# Altium footprint library MOLEX SMD.PcbLib: 54 footprints (part 3 of 4) (continued)
## MOLEX_78171-0004 [mm] "1.20mm Pitch Pico-EZmate Wire-to-Board Header, Vertical, Housing Height: 1.55mm, with Side-Friction Locks, 4 Circuits" (continued)
Mechanical 15:
  lines w0.05: -3.55,-4.59 -3.55,0.665 3.55,0.665 3.55,-4.59 -3.55,-4.59
3D body "MOLEX_78171-0004.stp": height 1.45, standoff 0, extent -3.3,-4.34 3.3,0.19

## MOLEX_78565-0001 [mm] "1.00mm Pitch Aerodynamic DDR3 RDIMM Socket, Low Profile, Vertical, Surface Mount, Black Housing and Latches, 240 Circuits, Lead-Free"
height 21.69
pads (243):
  rect 0.7x2.1 smd: 1(-49.5,-2.45) 2(-48.5,-2.45) 3(-47.5,-2.45) 4(-46.5,-2.45) 5(-45.5,-2.45) 6(-44.5,-2.45) 7(-43.5,-2.45) 8(-42.5,-2.45) 9(-41.5,-2.45) 10(-40.5,-2.45) 11(-39.5,-2.45) 12(-38.5,-2.45) 13(-37.5,-2.45) 14(-36.5,-2.45) 15(-35.5,-2.45) 16(-34.5,-2.45) 17(-33.5,-2.45) 18(-32.5,-2.45) 19(-31.5,-2.45) 20(-30.5,-2.45) 21(-29.5,-2.45) 22(-28.5,-2.45) 23(-27.5,-2.45) 24(-26.5,-2.45) 25(-25.5,-2.45) 26(-24.5,-2.45) 27(-23.5,-2.45) 28(-22.5,-2.45) 29(-21.5,-2.45) 30(-20.5,-2.45) 31(-19.5,-2.45) 32(-18.5,-2.45) 33(-17.5,-2.45) 34(-16.5,-2.45) 35(-15.5,-2.45) 36(-14.5,-2.45) 37(-13.5,-2.45) 38(-12.5,-2.45) 39(-11.5,-2.45) 40(-10.5,-2.45) 41(-9.5,-2.45) 42(-8.5,-2.45) 43(-7.5,-2.45) 44(-6.5,-2.45) 45(-5.5,-2.45) 46(-4.5,-2.45) 47(-3.5,-2.45) 48(-2.5,-2.45) 49(2.5,-2.45) 50(3.5,-2.45) 51(4.5,-2.45) 52(5.5,-2.45) 53(6.5,-2.45) 54(7.5,-2.45) 55(8.5,-2.45) 56(9.5,-2.45) 57(10.5,-2.45) 58(11.5,-2.45) 59(12.5,-2.45) 60(13.5,-2.45) 61(14.5,-2.45) 62(15.5,-2.45) 63(16.5,-2.45) 64(17.5,-2.45) 65(18.5,-2.45) 66(19.5,-2.45) 67(20.5,-2.45) 68(21.5,-2.45) 69(22.5,-2.45) 70(23.5,-2.45) 71(24.5,-2.45) 72(25.5,-2.45) 73(26.5,-2.45) 74(27.5,-2.45) 75(28.5,-2.45) 76(29.5,-2.45) 77(30.5,-2.45) 78(31.5,-2.45) 79(32.5,-2.45) 80(33.5,-2.45) 81(34.5,-2.45) 82(35.5,-2.45) 83(36.5,-2.45) 84(37.5,-2.45) 85(38.5,-2.45) 86(39.5,-2.45) 87(40.5,-2.45) 88(41.5,-2.45) 89(42.5,-2.45) 90(43.5,-2.45) 91(44.5,-2.45) 92(45.5,-2.45) 93(46.5,-2.45) 94(47.5,-2.45) 95(48.5,-2.45) 96(49.5,-2.45) 97(50.5,-2.45) 98(51.5,-2.45) 99(52.5,-2.45) 100(53.5,-2.45) 101(54.5,-2.45) 102(55.5,-2.45) 103(56.5,-2.45) 104(57.5,-2.45) 105(58.5,-2.45) 106(59.5,-2.45) 107(60.5,-2.45) 108(61.5,-2.45) 109(62.5,-2.45) 110(63.5,-2.45) 111(64.5,-2.45) 112(65.5,-2.45) 113(66.5,-2.45) 114(67.5,-2.45) 115(68.5,-2.45) 116(69.5,-2.45) 117(70.5,-2.45) 118(71.5,-2.45) 119(72.5,-2.45) 120(73.5,-2.45) 121(-49.5,2.45) 122(-48.5,2.45) 123(-47.5,2.45) 124(-46.5,2.45) 125(-45.5,2.45) 126(-44.5,2.45) 127(-43.5,2.45) 128(-42.5,2.45) 129(-41.5,2.45) 130(-40.5,2.45) 131(-39.5,2.45) 132(-38.5,2.45) 133(-37.5,2.45) 134(-36.5,2.45) 135(-35.5,2.45) 136(-34.5,2.45) 137(-33.5,2.45) 138(-32.5,2.45) 139(-31.5,2.45) 140(-30.5,2.45) 141(-29.5,2.45) 142(-28.5,2.45) 143(-27.5,2.45) 144(-26.5,2.45) 145(-25.5,2.45) 146(-24.5,2.45) 147(-23.5,2.45) 148(-22.5,2.45) 149(-21.5,2.45) 150(-20.5,2.45) 151(-19.5,2.45) 152(-18.5,2.45) 153(-17.5,2.45) 154(-16.5,2.45) 155(-15.5,2.45) 156(-14.5,2.45) 157(-13.5,2.45) 158(-12.5,2.45) 159(-11.5,2.45) 160(-10.5,2.45) 161(-9.5,2.45) 162(-8.5,2.45) 163(-7.5,2.45) 164(-6.5,2.45) 165(-5.5,2.45) 166(-4.5,2.45) 167(-3.5,2.45) 168(-2.5,2.45) 169(2.5,2.45) 170(3.5,2.45) 171(4.5,2.45) 172(5.5,2.45) 173(6.5,2.45) 174(7.5,2.45) 175(8.5,2.45) 176(9.5,2.45) 177(10.5,2.45) 178(11.5,2.45) 179(12.5,2.45) 180(13.5,2.45) 181(14.5,2.45) 182(15.5,2.45) 183(16.5,2.45) 184(17.5,2.45) 185(18.5,2.45) 186(19.5,2.45) 187(20.5,2.45) 188(21.5,2.45) 189(22.5,2.45) 190(23.5,2.45) 191(24.5,2.45) 192(25.5,2.45) 193(26.5,2.45) 194(27.5,2.45) 195(28.5,2.45) 196(29.5,2.45) 197(30.5,2.45) 198(31.5,2.45) 199(32.5,2.45) 200(33.5,2.45) 201(34.5,2.45) 202(35.5,2.45) 203(36.5,2.45) 204(37.5,2.45) 205(38.5,2.45) 206(39.5,2.45) 207(40.5,2.45) 208(41.5,2.45) 209(42.5,2.45) 210(43.5,2.45) 211(44.5,2.45) 212(45.5,2.45) 213(46.5,2.45) 214(47.5,2.45) 215(48.5,2.45) 216(49.5,2.45) 217(50.5,2.45) 218(51.5,2.45) 219(52.5,2.45) 220(53.5,2.45) 221(54.5,2.45) 222(55.5,2.45) 223(56.5,2.45) 224(57.5,2.45) 225(58.5,2.45) 226(59.5,2.45) 227(60.5,2.45) 228(61.5,2.45) 229(62.5,2.45) 230(63.5,2.45) 231(64.5,2.45) 232(65.5,2.45) 233(66.5,2.45) 234(67.5,2.45) 235(68.5,2.45) 236(69.5,2.45) 237(70.5,2.45) 238(71.5,2.45) 239(72.5,2.45) 240(73.5,2.45)
  round 3.2 hole 2.5 unplated mask+0.15: H1(-57,0) H2(0,0) H3(81,0)
Top Overlay:
  drawing of 164 lines, arcs and shapes, not listed
  text "240" at 74.4,3.6 h1
  text "1" at -50.6,-4.5 h1
Mechanical 8:
  drawing of 1927 lines, arcs and shapes, not listed
Mechanical 14:
  drawing of 204 lines, arcs and shapes, not listed
  text "240" at 74.4,3.6 h1
  text "1" at -50.6,-4.5 h1
3D body "MOLEX_78565-0001.stp": height 21.16, standoff -3.75, extent -64.885,-3.209 88.885,3.21

## MOLEX_85305-0232 [mm] "50 Ohms, SMP Surface Mount Plug, Limited Detent"
height 4.1
pads (2):
  rect 0.54x1.3 smd: 1(0,3.05)
  rect 0.5x0.5 smd paste-0.25 mask-0.25: 2(-2.35,2.35)
Top Layer:
  region: -2.6,-2.6 -2.6,2.6 -1,2.6 -1,1.732 -1.183,1.613 -1.504,1.319 -1.754,0.962 -1.92,0.56 -1.996,0.131 -1.977,-0.304 -1.864,-0.725 -1.663,-1.111 -1.383,-1.445 -1.038,-1.71 -0.643,-1.894 -0.218,-1.988 0.218,-1.988 0.643,-1.894 1.037,-1.71 1.383,-1.445 1.663,-1.111 1.864,-0.725 1.977,-0.304 1.996,0.131 1.92,0.56 1.753,0.962 1.504,1.319 1.183,1.613 1,1.732 1,2.6 2.6,2.6 2.6,-2.6
Top Overlay:
  circle w0.2: c0,0 r0.205
  circle w0.2: c0,0 r1.55
  lines w0.2: -0.65,1.997 cw(c0,0) 0.65,1.997
Mechanical 8:
  circle w0.05: c-2.079,-1.2 r0.2
  circle w0.05: c-1.2,-2.078 r0.2
  circle w0.05: c1.2,-2.078 r0.2
  circle w0.05: c2.078,-1.2 r0.2
  circle w0.05: c-1.543,1.839 r0.2
  circle w0.05: c-2.255,0.821 r0.2
  circle w0.05: c1.543,1.839 r0.2
  circle w0.05: c2.255,0.821 r0.2
  lines w0.05: -2.755,0.821 -2.255,0.821 ; -2.579,-1.2 -2.079,-1.2 ; -2.255,0.321 -2.255,0.821 ; -2.255,1.321 -2.255,0.821 ; -2.079,-1.7 -2.079,-1.2 ; -2.079,-0.7 -2.079,-1.2 ; -2.043,1.839 -1.543,1.839 ; -1.755,0.821 -2.255,0.821 ; -1.7,-2.078 -1.2,-2.078 ; -1.579,-1.2 -2.079,-1.2 ; -1.543,1.339 -1.543,1.839 ; -1.543,2.339 -1.543,1.839 ; -1.2,-2.578 -1.2,-2.078 ; -1.2,-1.578 -1.2,-2.078 ; -1.043,1.839 -1.543,1.839 ; -0.7,-2.078 -1.2,-2.078 ; -0.5,0 0,0 ; -0.5,3.05 0,3.05 ; 0,-0.5 0,0 ; 0,0.5 0,0 ; 0,2.55 0,3.05 ; 0,3.55 0,3.05 ; 0.5,0 0,0 ; 0.5,3.05 0,3.05 ; 0.7,-2.078 1.2,-2.078 ; 1.043,1.839 1.543,1.839 ; 1.2,-2.578 1.2,-2.078 ; 1.2,-1.578 1.2,-2.078 ; 1.543,1.339 1.543,1.839 ; 1.543,2.339 1.543,1.839 ; 1.578,-1.2 2.078,-1.2 ; 1.7,-2.078 1.2,-2.078 ; 1.755,0.821 2.255,0.821 ; 2.043,1.839 1.543,1.839 ; 2.078,-1.7 2.078,-1.2 ; 2.078,-0.7 2.078,-1.2 ; 2.255,0.321 2.255,0.821 ; 2.255,1.321 2.255,0.821 ; 2.578,-1.2 2.078,-1.2 ; 2.755,0.821 2.255,0.821 ; -2.6,-2.6 2.6,-2.6 2.6,2.6 1,2.6 1,1.732 cw(c0,0) -1,1.732 -1,2.6 -2.6,2.6 -2.6,-2.6 ; -0.27,2.4 0.27,2.4 0.27,3.7 -0.27,3.7 -0.27,2.4
Mechanical 14:
  circle w0.1: c0,0 r2.1
  circle w0.1: c0,0 r1.84
  circle w0.1: c0,0 r0.205
  circle w0.1: c0,0 r1.55
  lines w0.1: -2.54,-1.259 ccw(c0,0) -1.259,-2.54 ; -2.54,1.259 cw(c0,0) -1.259,2.54 ; -0.25,2.54 -0.25,3.54 0.25,3.54 0.25,2.54 ; 1.259,-2.54 ccw(c0,0) 2.54,-1.259 ; 1.259,2.54 cw(c0,0) 2.54,1.259 ; -2.54,-2.028 ccw(c0,0) -2.028,-2.54 2.027,-2.54 ccw(c0,0) 2.54,-2.028 2.54,2.028 ccw(c0,0) 2.027,2.54 -2.028,2.54 ccw(c0,0) -2.54,2.028 -2.54,-2.028
Mechanical 15:
  lines w0.05: -2.85,-2.85 -2.85,2.85 -0.52,2.85 -0.52,3.95 0.52,3.95 0.52,2.85 2.85,2.85 2.85,-2.85 -2.85,-2.85
3D body "MOLEX_85305-0232.stp": height 4.1, standoff 0, extent -2.54,-2.54 2.54,3.54

## MOLEX_85513-5014 [mm] "1.27mm Pitch, Modular Jack, Vertical, Top Entry, Surface Mount, 6/6, Low Profile"
height 12.7
pads (7):
  rect 5x0.76 smd: 1(-7.66,-3.175) 2(-7.66,-1.905) 3(-7.66,-0.635) 4(-7.66,0.635) 5(-7.66,1.905) 6(-7.66,3.175)
  rect 4.5x8.8 smd: SHIELD(8.39,0)
Top Overlay:
  lines w0.2: -7.54,-3.905 -7.54,-6.105 ccw(c-7.04,-6.105) -7.04,-6.605 7.04,-6.605 ccw(c7.04,-6.105) 7.54,-6.105 7.54,-4.75 ; -7.54,3.905 -7.54,6.105 cw(c-7.04,6.105) -7.04,6.605 7.04,6.605 cw(c7.04,6.105) 7.54,6.105 7.54,4.75
Mechanical 8:
  lines w0.05: -0.5,0 0,0 ; 0,-0.5 0,0 ; 0,0.5 0,0 ; 0.5,0 0,0 ; 7.89,0 8.39,0 ; 8.39,-0.5 8.39,0 ; 8.39,0.5 8.39,0 ; 8.89,0 8.39,0 ; -10.16,-3.555 -10.16,-2.795 -5.16,-2.795 -5.16,-3.555 -10.16,-3.555 ; -10.16,-2.285 -10.16,-1.525 -5.16,-1.525 -5.16,-2.285 -10.16,-2.285 ; -10.16,-1.015 -10.16,-0.255 -5.16,-0.255 -5.16,-1.015 -10.16,-1.015 ; -10.16,0.255 -10.16,1.015 -5.16,1.015 -5.16,0.255 -10.16,0.255 ; -10.16,1.525 -10.16,2.285 -5.16,2.285 -5.16,1.525 -10.16,1.525 ; -10.16,2.795 -10.16,3.555 -5.16,3.555 -5.16,2.795 -10.16,2.795 ; 6.14,-4.4 10.64,-4.4 10.64,4.4 6.14,4.4 6.14,-4.4
  lines w0.1: -8.16,-3.175 -7.66,-3.175 ; -8.16,-1.905 -7.66,-1.905 ; -8.16,-0.635 -7.66,-0.635 ; -8.16,0.635 -7.66,0.635 ; -8.16,1.905 -7.66,1.905 ; -8.16,3.175 -7.66,3.175 ; -7.66,-3.675 -7.66,-3.175 ; -7.66,-2.675 -7.66,-3.175 ; -7.66,-2.405 -7.66,-1.905 ; -7.66,-1.405 -7.66,-1.905 ; -7.66,-1.135 -7.66,-0.635 ; -7.66,-0.135 -7.66,-0.635 ; -7.66,0.135 -7.66,0.635 ; -7.66,1.135 -7.66,0.635 ; -7.66,1.405 -7.66,1.905 ; -7.66,2.405 -7.66,1.905 ; -7.66,2.675 -7.66,3.175 ; -7.66,3.675 -7.66,3.175 ; -7.16,-3.175 -7.66,-3.175 ; -7.16,-1.905 -7.66,-1.905 ; -7.16,-0.635 -7.66,-0.635 ; -7.16,0.635 -7.66,0.635 ; -7.16,1.905 -7.66,1.905 ; -7.16,3.175 -7.66,3.175 ; -0.5,0 0,0 ; 0,-0.5 0,0 ; 0,0.5 0,0 ; 0.5,0 0,0
Mechanical 14:
  lines w0.1: -7.54,-6.105 ccw(c-7.04,-6.105) -7.04,-6.605 7.04,-6.605 ccw(c7.04,-6.105) 7.54,-6.105 7.54,6.105 ccw(c7.04,6.105) 7.04,6.605 -7.04,6.605 ccw(c-7.04,6.105) -7.54,6.105 -7.54,-6.105 ; -3.34,-5.44 -3.34,5.44 4.46,5.44 4.46,3.85 6.21,3.85 6.21,2.525 7.02,2.525 7.02,-2.525 6.21,-2.525 6.21,-3.85 4.46,-3.85 4.46,-5.44 -3.34,-5.44
Mechanical 15:
  lines w0.05: -10.41,-3.805 -10.41,3.805 -10.16,3.805 -7.79,3.805 -7.79,6.605 -7.79,6.855 7.54,6.855 7.79,6.855 7.79,4.65 10.39,4.65 10.89,4.65 10.89,-4.65 7.79,-4.65 7.79,-6.855 -7.79,-6.855 -7.79,-3.805 -10.41,-3.805
3D body "MOLEX_85513-5014.stp": height 12.85, standoff 0, extent -9.54,-6.605 9.94,6.605

## MOLEX_87703-0001 [mm] "1.27mm Pitch Serial ATA Device Plug, 63.50mm Drive, Without Jumper, 22 Circuits"
height 4
pads (26):
  rect 3.66x4.4 smd: 1(-24.15,-4.8) 2(24.15,-4.8)
  round 0.5 hole 1.3 unplated mask+0.4: MTG1(-18.865,0) MTG2(18.865,0)
  rect 0.9x2.1 smd: P1(1.905,0) P2(0.635,0) P3(-0.635,0) P4(-1.905,0) P5(-3.175,0) P6(-4.445,0) P7(-5.715,0) P8(-6.985,0) P9(-8.255,0) P10(-9.525,0) P11(-10.795,0) P12(-12.065,0) P13(-13.335,0) P14(-14.605,0) P15(-15.875,0) S1(15.875,0) S2(14.605,0) S3(13.335,0) S4(12.065,0) S5(10.795,0) S6(9.525,0) S7(8.255,0)
Top Overlay:
  drawing of 164 lines, arcs and shapes, not listed
  text "S1" at 15.325,1.57 h1
  text "P1" at 1.38,1.62 h1
Keep-Out Layer:
  board cut-out: -21.765,-7.55 -21.765,-2.6 -21.765,-2.502 -21.727,-2.308 -21.651,-2.126 -21.542,-1.963 -21.402,-1.823 -21.239,-1.714 -21.057,-1.638 -20.864,-1.6 -20.765,-1.6 20.765,-1.6 20.864,-1.6 21.057,-1.638 21.239,-1.714 21.402,-1.823 21.542,-1.963 21.651,-2.126 21.727,-2.308 21.765,-2.502 21.765,-2.6 21.765,-7.55
Mechanical 1:
  lines w0.635: -21.765,-7.55 -21.765,-2.6 cw(c-20.765,-2.6) -20.765,-1.6 0,-1.6 20.765,-1.6 cw(c20.765,-2.6) 21.765,-2.6 21.765,-7.55
Mechanical 8:
  drawing of 215 lines, arcs and shapes, not listed
Mechanical 13:
  lines w0.254: 2.875,-2.65 2.875,-2.09
Mechanical 14:
  drawing of 190 lines, arcs and shapes, not listed
  text "S1" at 15.325,1.57 h1
  text "P1" at 1.38,1.62 h1
Mechanical 15:
  lines w0.05: -26.23,-7.8 -26.23,1.3 26.23,1.3 26.23,-7.8 -26.23,-7.8
3D body "MOLEX_87703-0001.stp": height 3.4, standoff -0.6, extent -25.465,-7.55 25.465,0.95

## MOLEX_87759-1650 [mm] "2.00mm (.079\") Pitch Milli-Grid™ Header, Vertical with Press-fit Plastic Pegs, 16 Circuits"
height 5.3
pads (18):
  rect 1x2.75 smd: 1(-7,-2.125) 2(-7,2.125) 3(-5,-2.125) 4(-5,2.125) 5(-3,-2.125) 6(-3,2.125) 7(-1,-2.125) 8(-1,2.125) 9(1,-2.125) 10(1,2.125) 11(3,-2.125) 12(3,2.125) 13(5,-2.125) 14(5,2.125) 15(7,-2.125) 16(7,2.125)
  round 0.5 hole 1 unplated mask+0.25: 15(-6,0) 16(6,0)
Top Overlay:
  circle w0.25: c-6.985,-4.064 r0.125
  lines w0.2: -7.85,-1.987 -7.95,-1.987 -7.95,-0.612 -7.85,-0.612 ; -7.85,0.638 -7.95,0.638 -7.95,2 -7.85,2 ; -6.15,-2 -5.85,-2 ; -6.15,2 -5.85,2 ; -6,-2 -6,-0.7 ; -6,0.7 -6,2 ; -4.15,-2 -3.85,-2 ; -4.15,2 -3.85,2 ; -4,-2 -4,2 ; -2.15,-2 -1.85,-2 ; -2.15,2 -1.85,2 ; -2,-2 -2,2 ; -0.15,-2 0.15,-2 ; -0.15,2 0.15,2 ; 0,-2 0,2 ; 1.85,-2 2.15,-2 ; 1.85,2 2.15,2 ; 2,-2 2,2 ; 3.85,-2 4.15,-2 ; 3.85,2 4.15,2 ; 4,-2 4,2 ; 5.85,-1.987 6.15,-1.987 ; 5.85,2 6.15,2 ; 6,-1.987 6,-0.7 ; 6,0.7 6,1.987 ; 7.85,-1.987 7.95,-1.987 7.95,-0.612 7.85,-0.612 ; 7.85,0.638 7.95,0.638 7.95,2 7.85,2
Mechanical 8:
  circle w0.05: c6,0 r0.5
  circle w0.05: c-6,0 r0.5
  lines w0.05: -7.5,-2.125 -7,-2.125 ; -7.5,2.125 -7,2.125 ; -7,-2.625 -7,-2.125 ; -7,-1.625 -7,-2.125 ; -7,1.625 -7,2.125 ; -7,2.625 -7,2.125 ; -6.5,-2.125 -7,-2.125 ; -6.5,0 -6,0 ; -6.5,2.125 -7,2.125 ; -6,-0.5 -6,0 ; -6,0.5 -6,0 ; -5.5,-2.125 -5,-2.125 ; -5.5,0 -6,0 ; -5.5,2.125 -5,2.125 ; -5,-2.625 -5,-2.125 ; -5,-1.625 -5,-2.125 ; -5,1.625 -5,2.125 ; -5,2.625 -5,2.125 ; -4.5,-2.125 -5,-2.125 ; -4.5,2.125 -5,2.125 ; -3.5,-2.125 -3,-2.125 ; -3.5,2.125 -3,2.125 ; -3,-2.625 -3,-2.125 ; -3,-1.625 -3,-2.125 ; -3,1.625 -3,2.125 ; -3,2.625 -3,2.125 ; -2.5,-2.125 -3,-2.125 ; -2.5,2.125 -3,2.125 ; -1.5,-2.125 -1,-2.125 ; -1.5,2.125 -1,2.125 ; -1,-2.625 -1,-2.125 ; -1,-1.625 -1,-2.125 ; -1,1.625 -1,2.125 ; -1,2.625 -1,2.125 ; -0.5,-2.125 -1,-2.125 ; -0.5,0 0,0 ; -0.5,2.125 -1,2.125 ; 0,-0.5 0,0 ; 0,0.5 0,0 ; 0.5,-2.125 1,-2.125 ; 0.5,0 0,0 ; 0.5,2.125 1,2.125 ; 1,-2.625 1,-2.125 ; 1,-1.625 1,-2.125 ; 1,1.625 1,2.125 ; 1,2.625 1,2.125 ; 1.5,-2.125 1,-2.125 ; 1.5,2.125 1,2.125 ; 2.5,-2.125 3,-2.125 ; 2.5,2.125 3,2.125 ; 3,-2.625 3,-2.125 ; 3,-1.625 3,-2.125 ; 3,1.625 3,2.125 ; 3,2.625 3,2.125 ; 3.5,-2.125 3,-2.125 ; 3.5,2.125 3,2.125 ; 4.5,-2.125 5,-2.125 ; 4.5,2.125 5,2.125 ; 5,-2.625 5,-2.125 ; 5,-1.625 5,-2.125 ; 5,1.625 5,2.125 ; 5,2.625 5,2.125 ; 5.5,-2.125 5,-2.125 ; 5.5,0 6,0 ; 5.5,2.125 5,2.125 ; 6,-0.5 6,0 ; 6,0.5 6,0 ; 6.5,-2.125 7,-2.125 ; 6.5,0 6,0 ; 6.5,2.125 7,2.125 ; 7,-2.625 7,-2.125 ; 7,-1.625 7,-2.125 ; 7,1.625 7,2.125 ; 7,2.625 7,2.125 ; 7.5,-2.125 7,-2.125 ; 7.5,2.125 7,2.125
Mechanical 14:
  drawing of 311 lines, arcs and shapes, not listed
Mechanical 15:
  lines w0.05: -8.2,-3.75 -8.2,3.75 8.2,3.75 8.2,-3.75 -8.2,-3.75
3D body "MOLEX_87759-1650.stp": height 6.5, standoff -1.5, extent -7.95,-2.75 7.95,2.75

## MOLEX_87782-3003 [mm] "0.6mm Pitch miniDIMM DDR3 Socket, Surface Mount, Vertical, 1.5V Voltage Key, 244 Circuits"
height 16.4
pads (250):
  rect 0.35x1.75 smd: 1(-40.2,-1.38) 2(-39.6,-1.38) 3(-39,-1.38) 4(-38.4,-1.38) 5(-37.8,-1.38) 6(-37.2,-1.38) 7(-36.6,-1.38) 8(-36,-1.38) 9(-35.4,-1.38) 10(-34.8,-1.38) 11(-34.2,-1.38) 12(-33.6,-1.38) 13(-33,-1.38) 14(-32.4,-1.38) 15(-31.8,-1.38) 16(-31.2,-1.38) 17(-30.6,-1.38) 18(-30,-1.38) 19(-29.4,-1.38) 20(-28.8,-1.38) 21(-28.2,-1.38) 22(-27.6,-1.38) 23(-27,-1.38) 24(-26.4,-1.38) 25(-25.8,-1.38) 26(-25.2,-1.38) 27(-24.6,-1.38) 28(-24,-1.38) 29(-23.4,-1.38) 30(-22.8,-1.38) 31(-22.2,-1.38) 32(-21.6,-1.38) 33(-21,-1.38) 34(-20.4,-1.38) 35(-19.8,-1.38) 36(-19.2,-1.38) 37(-18.6,-1.38) 38(-18,-1.38) 39(-17.4,-1.38) 40(-16.8,-1.38) 41(-16.2,-1.38) 42(-15.6,-1.38) 43(-15,-1.38) 44(-14.4,-1.38) 45(-13.8,-1.38) 46(-13.2,-1.38) 47(-12.6,-1.38) 48(-12,-1.38) 49(-11.4,-1.38) 50(-10.8,-1.38) 51(-10.2,-1.38) 52(-9.6,-1.38) 53(-9,-1.38) 54(-8.4,-1.38) 55(-7.8,-1.38) 56(-7.2,-1.38) 57(-6.6,-1.38) 58(-6,-1.38) 59(-5.4,-1.38) 60(-4.8,-1.38) 61(-4.2,-1.38) 62(-3.6,-1.38) 63(-3,-1.38) 64(-2.4,-1.38) 65(-1.8,-1.38) 66(1.8,-1.38) 67(2.4,-1.38) 68(3,-1.38) 69(3.6,-1.38) 70(4.2,-1.38) 71(4.8,-1.38) 72(5.4,-1.38) 73(6,-1.38) 74(6.6,-1.38) 75(7.2,-1.38) 76(7.8,-1.38) 77(8.4,-1.38) 78(9,-1.38) 79(9.6,-1.38) 80(10.2,-1.38) 81(10.8,-1.38) 82(11.4,-1.38) 83(12,-1.38) 84(12.6,-1.38) 85(13.2,-1.38) 86(13.8,-1.38) 87(14.4,-1.38) 88(15,-1.38) 89(15.6,-1.38) 90(16.2,-1.38) 91(16.8,-1.38) 92(17.4,-1.38) 93(18,-1.38) 94(18.6,-1.38) 95(19.2,-1.38) 96(19.8,-1.38) 97(20.4,-1.38) 98(21,-1.38) 99(21.6,-1.38) 100(22.2,-1.38) 101(22.8,-1.38) 102(23.4,-1.38) 103(24,-1.38) 104(24.6,-1.38) 105(25.2,-1.38) 106(25.8,-1.38) 107(26.4,-1.38) 108(27,-1.38) 109(27.6,-1.38) 110(28.2,-1.38) 111(28.8,-1.38) 112(29.4,-1.38) 113(30,-1.38) 114(30.6,-1.38) 115(31.2,-1.38) 116(31.8,-1.38) 117(32.4,-1.38) 118(33,-1.38) 119(33.6,-1.38) 120(34.2,-1.38) 121(34.8,-1.38) 122(35.4,-1.38) 123(-40.2,1.38) 124(-39.6,1.38) 125(-39,1.38) 126(-38.4,1.38) 127(-37.8,1.38) 128(-37.2,1.38) 129(-36.6,1.38) 130(-36,1.38) 131(-35.4,1.38) 132(-34.8,1.38) 133(-34.2,1.38) 134(-33.6,1.38) 135(-33,1.38) 136(-32.4,1.38) 137(-31.8,1.38) 138(-31.2,1.38) 139(-30.6,1.38) 140(-30,1.38) 141(-29.4,1.38) 142(-28.8,1.38) 143(-28.2,1.38) 144(-27.6,1.38) 145(-27,1.38) 146(-26.4,1.38) 147(-25.8,1.38) 148(-25.2,1.38) 149(-24.6,1.38) 150(-24,1.38) 151(-23.4,1.38) 152(-22.8,1.38) 153(-22.2,1.38) 154(-21.6,1.38) 155(-21,1.38) 156(-20.4,1.38) 157(-19.8,1.38) 158(-19.2,1.38) 159(-18.6,1.38) 160(-18,1.38) 161(-17.4,1.38) 162(-16.8,1.38) 163(-16.2,1.38) 164(-15.6,1.38) 165(-15,1.38) 166(-14.4,1.38) 167(-13.8,1.38) 168(-13.2,1.38) 169(-12.6,1.38) 170(-12,1.38) 171(-11.4,1.38) 172(-10.8,1.38) 173(-10.2,1.38) 174(-9.6,1.38) 175(-9,1.38) 176(-8.4,1.38) 177(-7.8,1.38) 178(-7.2,1.38) 179(-6.6,1.38) 180(-6,1.38) 181(-5.4,1.38) 182(-4.8,1.38) 183(-4.2,1.38) 184(-3.6,1.38) 185(-3,1.38) 186(-2.4,1.38) 187(-1.8,1.38) 188(1.8,1.38) 189(2.4,1.38) 190(3,1.38) 191(3.6,1.38) 192(4.2,1.38) 193(4.8,1.38) 194(5.4,1.38) 195(6,1.38) 196(6.6,1.38) 197(7.2,1.38) 198(7.8,1.38) 199(8.4,1.38) 200(9,1.38) 201(9.6,1.38) 202(10.2,1.38) 203(10.8,1.38) 204(11.4,1.38) 205(12,1.38) 206(12.6,1.38) 207(13.2,1.38) 208(13.8,1.38) 209(14.4,1.38) 210(15,1.38) 211(15.6,1.38) 212(16.2,1.38) 213(16.8,1.38) 214(17.4,1.38) 215(18,1.38) 216(18.6,1.38) 217(19.2,1.38) 218(19.8,1.38) 219(20.4,1.38) 220(21,1.38) 221(21.6,1.38) 222(22.2,1.38) 223(22.8,1.38) 224(23.4,1.38) 225(24,1.38) 226(24.6,1.38) 227(25.2,1.38) 228(25.8,1.38) 229(26.4,1.38) 230(27,1.38) 231(27.6,1.38) 232(28.2,1.38) 233(28.8,1.38) 234(29.4,1.38) 235(30,1.38) 236(30.6,1.38) 237(31.2,1.38) 238(31.8,1.38) 239(32.4,1.38) 240(33,1.38) 241(33.6,1.38) 242(34.2,1.38) 243(34.8,1.38) 244(35.4,1.38)
  round 0.5 hole 1.5 unplated mask+0.5: MTG1(0,0)
  round 0.5 hole 1.4 unplated mask+0.45: MTG2(36.6,0)
  rect 6.5x6 smd: P1(-47.6,0) P4(42.75,0)
  rect 2.8x2.77 smd: P2(0,3.08) P3(0,-3.08)
Top Overlay:
  lines w0.2: -50.4,-3.5 -41.6,-3.5 -41.6,3.5 -50.4,3.5 ; -50.4,-3.35 -50.4,-3.95 -47.89,-3.95 -47.89,-3.5 ; -50.4,3.35 -50.4,3.95 -47.89,3.95 -47.89,3.5 ; -46.11,-3.5 -46.11,-3.95 -40.7,-3.95 ; -46.11,3.5 -46.11,3.95 -40.35,3.95 -40.35,2.605 ; -41.6,-2.75 -41.2,-2.75 -41.2,2.75 -41.6,2.75 ; 35.55,-2.605 35.55,-3.95 41.31,-3.95 41.31,-3.5 ; 35.925,-1.35 36.4,-1.35 ; 35.925,1.35 36.4,1.35 ; 35.95,-0.825 35.95,-1.15 36.4,-1.15 ; 35.95,0.825 35.95,1.15 36.4,1.15 ; 36.4,-1.031 36.4,-2.75 36.8,-2.75 ; 36.4,1.031 36.4,2.75 36.8,2.75 ; 36.4,3.95 41.31,3.95 41.31,3.5 ; 36.8,-1.031 36.8,-3.5 45.6,-3.5 ; 36.8,1.031 36.8,3.5 45.6,3.5 ; 43.083,-3.5 43.09,-3.95 45.6,-3.95 45.6,-3.35 ; 43.09,3.5 43.09,3.95 45.6,3.95 45.6,3.35
  text "244" at 33.6,2.7 h1
  text "1" at -40.3,-3.7 h1
Mechanical 8:
  drawing of 1510 lines, arcs and shapes, not listed
Mechanical 14:
  drawing of 219 lines, arcs and shapes, not listed
Mechanical 15:
  lines w0.1: -51.1,-2.255 -51.1,4.715 46.25,4.715 46.25,-2.255 -51.1,-2.255
3D body "MOLEX_87782-3003.stp": height 16.4, standoff -1.55, extent -50.4,-3.95 45.6,3.95

## MOLEX_87832-0820 [mm] "Milli-Grid, Pitch 2mm, 8 contacts, Surface Mount Vertical Header With Locking Window And Centre Polarization Slot"
height 6.4
pads (10):
  rect 1x2.75 smd: 1(-3,-2.125) 2(-3,2.125) 3(-1,-2.125) 4(-1,2.125) 5(1,-2.125) 6(1,2.125) 7(3,-2.125) 8(3,2.125)
  round 0.5 hole 1 unplated mask+0.25: 9(-2,0) 10(2,0)
Top Overlay:
  circle w0.25: c-2.985,-4.064 r0.125
  lines w0.2: -5.325,-1.5 -4.675,-1.5 ; -5.325,0.5 -4.675,0.5 ; -3.8,-3.15 -5.325,-3.15 ; -3.8,-2.5 -4.675,-2.5 ; -3.8,2.5 -4.675,2.5 ; -3.8,3.15 -5.325,3.15 ; 3.8,-3.15 5.325,-3.15 ; 3.8,-2.5 4.675,-2.5 ; 3.8,2.5 4.675,2.5 ; 3.8,3.15 5.325,3.15 ; 4.675,-0.5 5.325,-0.5 ; 4.675,1.5 5.325,1.5 ; -5.325,-3.15 -5.325,3.15 ; -5.325,-3.15 -4.675,-2.5 ; -5.325,3.15 -4.675,2.5 ; -4.675,-2.5 -4.675,2.5 ; 4.675,-2.5 5.325,-3.15 ; 4.675,-2.5 5.325,-3.15 ; 4.675,-2.5 4.675,2.5 ; 4.675,2.5 5.325,3.15 ; 4.675,2.5 5.325,3.15 ; 5.325,-3.15 5.325,3.15
Mechanical 14:
  lines w0.1: -5.325,-1.5 -4.675,-1.5 ; -5.325,0.5 -4.675,0.5 ; -1.2,-3.15 -1.2,-2.5 ; 1.2,-3.15 1.2,-2.5 ; 4.675,-0.5 5.325,-0.5 ; 4.675,1.5 5.325,1.5 ; -5.325,-3.15 5.325,-3.15 ; -5.325,-3.15 -4.675,-2.5 ; -5.325,-3.15 -5.325,3.15 ; -5.325,3.15 5.325,3.15 ; -5.325,3.15 -4.675,2.5 ; -4.675,-2.5 -4.675,2.5 ; -4.675,-2.5 4.675,-2.5 ; -4.675,2.5 4.675,2.5 ; 4.675,-2.5 4.675,2.5 ; 4.675,-2.5 5.325,-3.15 ; 4.675,-2.5 5.325,-3.15 ; 4.675,2.5 5.325,3.15 ; 4.675,2.5 5.325,3.15 ; 5.325,-3.15 5.325,3.15
Mechanical 15:
  lines w0.05: -5.575,-3.765 -5.575,3.765 5.575,3.765 5.575,-3.765 -5.575,-3.765
3D body "MOLEX_87832-0820.stp": height 7.6, standoff -0.75, extent -5.325,-3.15 5.325,3.15

## MOLEX_87832-1220 [mm] "Milli-Grid, Pitch 2mm, 12 contacts, Surface Mount Vertical Header With Locking Window And Centre Polarization Slot"
height 6.4
pads (14):
  rect 1x2.75 smd: 1(-5,-2.125) 2(-5,2.125) 3(-3,-2.125) 4(-3,2.125) 5(-1,-2.125) 6(-1,2.125) 7(1,-2.125) 8(1,2.125) 9(3,-2.125) 10(3,2.125) 11(5,-2.125) 12(5,2.125)
  round 0.5 hole 1 unplated mask+0.25: 13(-4,0) 14(4,0)
Top Overlay:
  circle w0.25: c-4.985,-4.064 r0.125
  lines w0.2: -7.325,-1.5 -6.675,-1.5 ; -7.325,0.5 -6.675,0.5 ; -5.8,-3.15 -7.325,-3.15 ; -5.8,-2.5 -6.675,-2.5 ; -5.8,2.5 -6.675,2.5 ; -5.8,3.15 -7.325,3.15 ; 5.8,-3.15 7.325,-3.15 ; 5.8,-2.5 6.675,-2.5 ; 5.8,2.5 6.675,2.5 ; 5.8,3.15 7.325,3.15 ; 6.675,-0.5 7.325,-0.5 ; 6.675,1.5 7.325,1.5 ; -7.325,-3.15 -7.325,3.15 ; -7.325,-3.15 -6.675,-2.5 ; -7.325,3.15 -6.675,2.5 ; -6.675,-2.5 -6.675,2.5 ; 6.675,-2.5 6.675,2.5 ; 6.675,-2.5 7.325,-3.15 ; 6.675,-2.5 7.325,-3.15 ; 6.675,2.5 7.325,3.15 ; 6.675,2.5 7.325,3.15 ; 7.325,-3.15 7.325,3.15
Mechanical 8:
  circle w0.1: c-4,0 r0.5
  circle w0.1: c4,0 r0.5
  lines w0.1: -5.5,-2.125 -5,-2.125 ; -5.5,2.125 -5,2.125 ; -5,-2.625 -5,-2.125 ; -5,-1.625 -5,-2.125 ; -5,1.625 -5,2.125 ; -5,2.625 -5,2.125 ; -4.5,-2.125 -5,-2.125 ; -4.5,0 -4,0 ; -4.5,2.125 -5,2.125 ; -4,-0.5 -4,0 ; -4,0.5 -4,0 ; -3.5,-2.125 -3,-2.125 ; -3.5,0 -4,0 ; -3.5,2.125 -3,2.125 ; -3,-2.625 -3,-2.125 ; -3,-1.625 -3,-2.125 ; -3,1.625 -3,2.125 ; -3,2.625 -3,2.125 ; -2.5,-2.125 -3,-2.125 ; -2.5,2.125 -3,2.125 ; -1.5,-2.125 -1,-2.125 ; -1.5,2.125 -1,2.125 ; -1,-2.625 -1,-2.125 ; -1,-1.625 -1,-2.125 ; -1,1.625 -1,2.125 ; -1,2.625 -1,2.125 ; -0.5,-2.125 -1,-2.125 ; -0.5,0 0,0 ; -0.5,2.125 -1,2.125 ; 0,-0.5 0,0 ; 0,0.5 0,0 ; 0.5,-2.125 1,-2.125 ; 0.5,0 0,0 ; 0.5,2.125 1,2.125 ; 1,-2.625 1,-2.125 ; 1,-1.625 1,-2.125 ; 1,1.625 1,2.125 ; 1,2.625 1,2.125 ; 1.5,-2.125 1,-2.125 ; 1.5,2.125 1,2.125 ; 2.5,-2.125 3,-2.125 ; 2.5,2.125 3,2.125 ; 3,-2.625 3,-2.125 ; 3,-1.625 3,-2.125 ; 3,1.625 3,2.125 ; 3,2.625 3,2.125 ; 3.5,-2.125 3,-2.125 ; 3.5,0 4,0 ; 3.5,2.125 3,2.125 ; 4,-0.5 4,0 ; 4,0.5 4,0 ; 4.5,-2.125 5,-2.125 ; 4.5,0 4,0 ; 4.5,2.125 5,2.125 ; 5,-2.625 5,-2.125 ; 5,-1.625 5,-2.125 ; 5,1.625 5,2.125 ; 5,2.625 5,2.125 ; 5.5,-2.125 5,-2.125 ; 5.5,2.125 5,2.125 ; -5.5,-3.5 -4.5,-3.5 -4.5,-0.75 -5.5,-0.75 -5.5,-3.5 ; -5.5,0.75 -4.5,0.75 -4.5,3.5 -5.5,3.5 -5.5,0.75 ; -3.5,-3.5 -2.5,-3.5 -2.5,-0.75 -3.5,-0.75 -3.5,-3.5 ; -3.5,0.75 -2.5,0.75 -2.5,3.5 -3.5,3.5 -3.5,0.75 ; -1.5,-3.5 -0.5,-3.5 -0.5,-0.75 -1.5,-0.75 -1.5,-3.5 ; -1.5,0.75 -0.5,0.75 -0.5,3.5 -1.5,3.5 -1.5,0.75 ; 0.5,-3.5 1.5,-3.5 1.5,-0.75 0.5,-0.75 0.5,-3.5 ; 0.5,0.75 1.5,0.75 1.5,3.5 0.5,3.5 0.5,0.75 ; 2.5,-3.5 3.5,-3.5 3.5,-0.75 2.5,-0.75 2.5,-3.5 ; 2.5,0.75 3.5,0.75 3.5,3.5 2.5,3.5 2.5,0.75 ; 4.5,-3.5 5.5,-3.5 5.5,-0.75 4.5,-0.75 4.5,-3.5 ; 4.5,0.75 5.5,0.75 5.5,3.5 4.5,3.5 4.5,0.75
Mechanical 14:
  lines w0.1: -7.325,-1.5 -6.675,-1.5 ; -7.325,0.5 -6.675,0.5 ; -1.2,-3.15 -1.2,-2.5 ; 1.2,-3.15 1.2,-2.5 ; 6.675,-0.5 7.325,-0.5 ; 6.675,1.5 7.325,1.5 ; -7.325,-3.15 -7.325,3.15 ; -7.325,-3.15 -6.675,-2.5 ; -7.325,-3.15 7.325,-3.15 ; -7.325,3.15 -6.675,2.5 ; -7.325,3.15 7.325,3.15 ; -6.675,-2.5 6.675,-2.5 ; -6.675,-2.5 -6.675,2.5 ; -6.675,2.5 6.675,2.5 ; 6.675,-2.5 6.675,2.5 ; 6.675,-2.5 7.325,-3.15 ; 6.675,-2.5 7.325,-3.15 ; 6.675,2.5 7.325,3.15 ; 6.675,2.5 7.325,3.15 ; 7.325,-3.15 7.325,3.15
Mechanical 15:
  lines w0.05: -7.575,-3.75 7.575,-3.75 7.575,3.75 -7.575,3.75 -7.575,-3.75
3D body "MOLEX_87832-1220.stp": height 7.6, standoff -0.75, extent -7.325,-3.15 7.325,3.15

## MOLEX_87832-1420 [mm] "Milli-Grid, Pitch 2mm, 14 contacts, Surface Mount Vertical Header With Locking Window And Centre Polarization Slot"
height 6.4
pads (16):
  rect 1x2.75 smd: 1(-6,-2.125) 2(-6,2.125) 3(-4,-2.125) 4(-4,2.125) 5(-2,-2.125) 6(-2,2.125) 7(0,-2.125) 8(0,2.125) 9(2,-2.125) 10(2,2.125) 11(4,-2.125) 12(4,2.125) 13(6,-2.125) 14(6,2.125)
  round 0.5 hole 1 unplated mask+0.25: 15(-5,0) 16(5,0)
Top Overlay:
  circle w0.25: c-5.985,-4.064 r0.125
  lines w0.2: -8.325,-1.5 -7.675,-1.5 ; -8.325,0.5 -7.675,0.5 ; -6.8,-3.15 -8.325,-3.15 ; -6.8,-2.5 -7.675,-2.5 ; -6.8,2.5 -7.675,2.5 ; -6.8,3.15 -8.325,3.15 ; 6.8,-3.15 8.325,-3.15 ; 6.8,-2.5 7.675,-2.5 ; 6.8,2.5 7.675,2.5 ; 6.8,3.15 8.325,3.15 ; 7.675,-0.5 8.325,-0.5 ; 7.675,1.5 8.325,1.5 ; -8.325,-3.15 -8.325,3.15 ; -8.325,-3.15 -7.675,-2.5 ; -8.325,3.15 -7.675,2.5 ; -7.675,-2.5 -7.675,2.5 ; 7.675,-2.5 8.325,-3.15 ; 7.675,-2.5 8.325,-3.15 ; 7.675,-2.5 7.675,2.5 ; 7.675,2.5 8.325,3.15 ; 7.675,2.5 8.325,3.15 ; 8.325,-3.15 8.325,3.15
Mechanical 14:
  lines w0.1: -8.325,-1.5 -7.675,-1.5 ; -8.325,0.5 -7.675,0.5 ; -1.2,-3.15 -1.2,-2.5 ; 1.2,-3.15 1.2,-2.5 ; 7.675,-0.5 8.325,-0.5 ; 7.675,1.5 8.325,1.5 ; -8.325,-3.15 8.325,-3.15 ; -8.325,-3.15 -7.675,-2.5 ; -8.325,-3.15 -8.325,3.15 ; -8.325,3.15 8.325,3.15 ; -8.325,3.15 -7.675,2.5 ; -7.675,-2.5 -7.675,2.5 ; -7.675,-2.5 7.675,-2.5 ; -7.675,2.5 7.675,2.5 ; 7.675,-2.5 7.675,2.5 ; 7.675,-2.5 8.325,-3.15 ; 7.675,-2.5 8.325,-3.15 ; 7.675,2.5 8.325,3.15 ; 7.675,2.5 8.325,3.15 ; 8.325,-3.15 8.325,3.15
Mechanical 15:
  lines w0.05: -8.575,-3.765 -8.575,3.765 8.575,3.765 8.575,-3.765 -8.575,-3.765
3D body "MOLEX_87832-1420.stp": height 7.6, standoff -0.75, extent -8.325,-3.15 8.325,3.15